# Altium footprint library Altium_Lib.PcbLib: 334 footprints (part 21 of 21)
Each footprint in its own frame and in the unit in brackets; x right, y up, seen from the top. Pads: shape width x height; smd on the part's side, far side on the other; paste and mask are expansions set on the pad; w line width, h text height; cw(c..) or ccw(c..) is an arc to the next point about the centre after c.
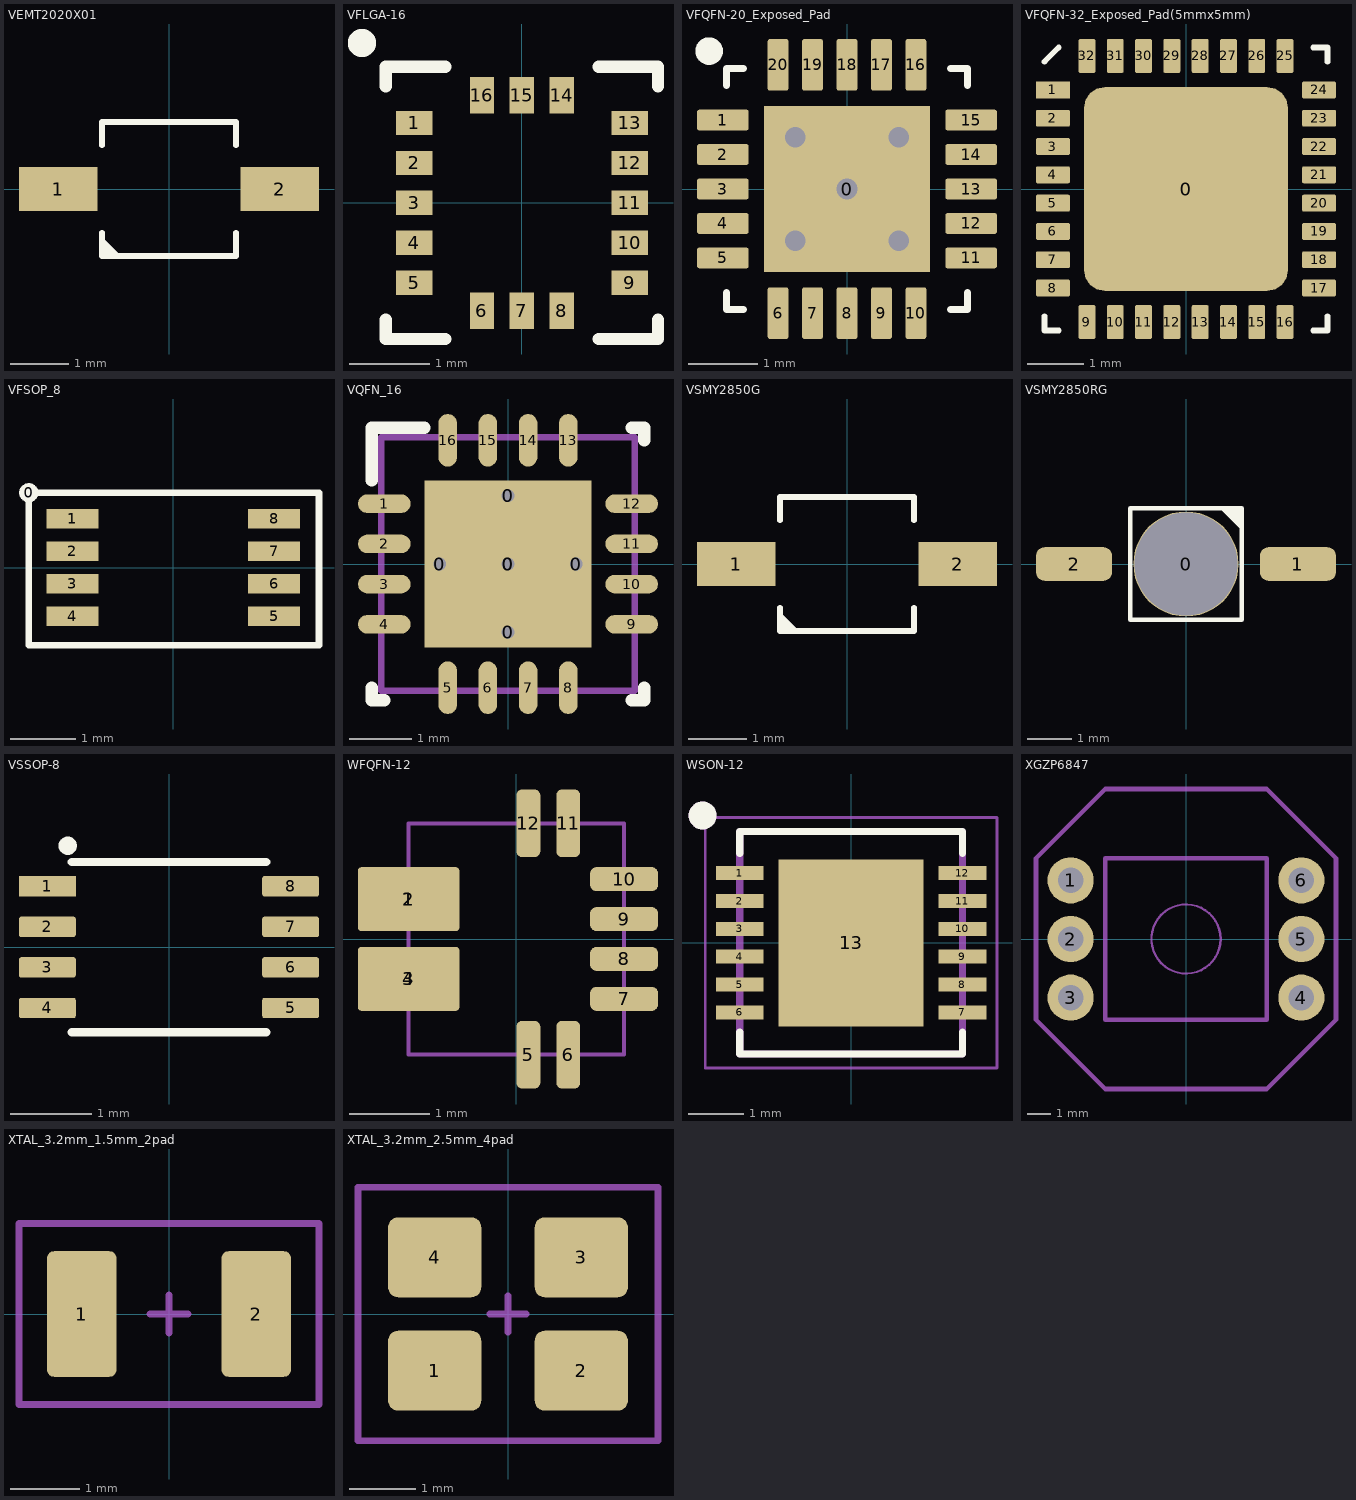
[diagram p20: the footprints below, top view; thin cyan lines are the x and y axes]

## VEMT2020X01 [mm]
pads (2):
  rect 1.35x0.75 smd: 1(-1.9,0) 2(1.9,0)
Top Overlay:
  region: -1.15,-0.825 -0.825,-1.15 -1.15,-1.15
  lines w0.1: -1.15,-0.75 -1.15,-1.15 0.85,-1.15 1.15,-1.15 1.15,-0.75 ; -1.15,0.75 -1.15,1.15 1.15,1.15 1.15,0.75
3D body "User Library-VEMT2020X01.STEP": height 2.77, standoff 0.05, extent -2.1,-1.15 2.1,1.15

## VFLGA-16 [mil]
height 39.37
pads (16):
  rect 18x12 smd: 1(-53,39.37) 2(-53,19.68) 3(-53,0) 4(-53,-19.68) 5(-53,-39.37) 9(53,-39.37) 10(53,-19.68) 11(53,0) 12(53,19.68) 13(53,39.37)
  rect 12x18 smd: 6(-19.68,-53) 7(0,-53) 8(19.68,-53) 14(19.68,53) 15(0,53) 16(-19.68,53)
Top Overlay:
  circle w10: c-78.74,78.74 r1.97
  lines w6: -67,-57.48 -67,-67 -37.79,-67 ; -67,57.48 -67,67 -37.79,67 ; 37.79,-67 67,-67 67,-57.48 ; 37.79,67 67,67 67,57.48
3D body "LGA-16_3x3x1mm_STM.step": height 39.09, standoff 0, extent -62,-62.01 62.01,62.01

## VFQFN-20_Exposed_Pad [mm]
pads (21):
  rect 2.4x2.4 smd mask-2.8: 0(0,0)
  rrect20% 0.75x0.3 smd mask+0.05: 1(-1.8,1) 2(-1.8,0.5) 3(-1.8,0) 4(-1.8,-0.5) 5(-1.8,-1) 11(1.8,-1) 12(1.8,-0.5) 13(1.8,0) 14(1.8,0.5) 15(1.8,1)
  rrect20% 0.3x0.75 smd mask+0.05: 6(-1,-1.8) 7(-0.5,-1.8) 8(0,-1.8) 9(0.5,-1.8) 10(1,-1.8) 16(1,1.8) 17(0.5,1.8) 18(0,1.8) 19(-0.5,1.8) 20(-1,1.8)
via 0,0 diameter 0.5 hole 0.3
via -0.75,-0.75 diameter 0.5 hole 0.3
via -0.75,0.75 diameter 0.5 hole 0.3
via 0.75,0.75 diameter 0.5 hole 0.3
via 0.75,-0.75 diameter 0.5 hole 0.3
Top Overlay:
  circle w0.2: c-2,2 r0.1
  lines w0.1: -1.75,-1.5 -1.75,-1.75 -1.5,-1.75 ; -1.75,1.5 -1.75,1.75 -1.5,1.75 ; 1.5,-1.75 1.75,-1.75 1.75,-1.5 ; 1.5,1.75 1.75,1.75 1.75,1.5
Top Solder:
  rectangle: -1.15,-0.4 -0.35,0.4
  rectangle: 0.35,-0.4 1.15,0.4
  rectangle: -0.4,0.35 0.4,1.15
  rectangle: -0.4,-1.15 0.4,-0.35
3D body "User Library-PVQFN20-RGR.STEP": height 1, standoff 0, extent -1.751,-1.751 1.751,1.751

## VFQFN-32_Exposed_Pad(5mmx5mm) [mm]
pads (33):
  rrect20% 3.6x3.6 smd mask+0.05: 0(0,0)
  rect 0.6x0.3 smd mask+0.05: 1(-2.35,1.75)
  rrect20% 0.6x0.3 smd mask+0.05: 2(-2.35,1.25) 3(-2.35,0.75) 4(-2.35,0.25) 5(-2.35,-0.25) 6(-2.35,-0.75) 7(-2.35,-1.25) 8(-2.35,-1.75) 17(2.35,-1.75) 18(2.35,-1.25) 19(2.35,-0.75) 20(2.35,-0.25) 21(2.35,0.25) 22(2.35,0.75) 23(2.35,1.25) 24(2.35,1.75)
  rrect20% 0.3x0.6 smd mask+0.05: 9(-1.75,-2.35) 10(-1.25,-2.35) 11(-0.75,-2.35) 12(-0.25,-2.35) 13(0.25,-2.35) 14(0.75,-2.35) 15(1.25,-2.35) 16(1.75,-2.35) 25(1.75,2.35) 26(1.25,2.35) 27(0.75,2.35) 28(0.25,2.35) 29(-0.25,2.35) 30(-0.75,2.35) 31(-1.25,2.35) 32(-1.75,2.35)
Top Overlay:
  lines w0.1: -2.5,-2.25 -2.5,-2.5 -2.25,-2.5 ; -2.5,2.25 -2.25,2.5 ; 2.25,-2.5 2.5,-2.5 2.5,-2.25 ; 2.25,2.5 2.5,2.5 2.5,2.25
3D body "User Library-VQFN-32.STEP": height 1.01, standoff 0, extent -2.56,-2.56 2.56,2.56

## VFSOP_8 [mm]
pads (9):
  round 0.3 on Top Overlay: 0(-2.22,1.15)
  rect 0.8x0.3 smd: 1(-1.55,0.75) 2(-1.55,0.25) 3(-1.55,-0.25) 4(-1.55,-0.75) 5(1.55,-0.75) 6(1.55,-0.25) 7(1.55,0.25) 8(1.55,0.75)
Top Overlay:
  lines w0.1: -2.22,-1.19 -2.22,1.15 2.24,1.15 2.24,-1.19 -2.22,-1.19
3D body "User Library-TI_DCU.STEP": height 0.9, standoff 0, extent -1.587,-1.01 1.52,0.99

## VQFN_16 [mm]
pads (22):
  round 0.5 hole 0.203 mask-25.4: 0(-1.1,0) 0(0,-1.1) 0(0,0) 0(0,1.1) 0(1.1,0)
  rect 2.7x2.7 smd: 0(0,0)
  oval 0.85x0.3 smd: 1(-2,0.975) 2(-2,0.325) 3(-2,-0.325) 4(-2,-0.975) 9(2,-0.975) 10(2,-0.325) 11(2,0.325) 12(2,0.975)
  oval 0.3x0.85 smd: 5(-0.975,-2) 6(-0.325,-2) 7(0.325,-2) 8(0.975,-2) 13(0.975,2) 14(0.325,2) 15(-0.325,2) 16(-0.975,2)
Top Overlay:
  lines w0.2: -2.2,-2 -2.2,-2.2 -2,-2.2 ; -2.2,1.35 -2.2,2.2 -1.35,2.2 ; 2,-2.2 2.2,-2.2 2.2,-2 ; 2,2.2 2.2,2.2 2.2,2
Top Solder:
  region: 0,1.407 -0.117,1.383 -0.217,1.317 -0.283,1.217 -0.307,1.1 -0.283,0.983 -0.217,0.883 -0.117,0.817 0,0.793 0.117,0.817 0.217,0.883 0.283,0.983 0.307,1.1 0.283,1.217 0.217,1.317 0.117,1.383
  region: -1.1,0.307 -1.217,0.283 -1.317,0.217 -1.383,0.117 -1.407,0 -1.383,-0.117 -1.317,-0.217 -1.217,-0.283 -1.1,-0.307 -0.983,-0.283 -0.883,-0.217 -0.817,-0.117 -0.793,0 -0.817,0.117 -0.883,0.217 -0.983,0.283
  region: 0,0.307 -0.117,0.283 -0.217,0.217 -0.283,0.117 -0.307,0 -0.283,-0.117 -0.217,-0.217 -0.117,-0.283 0,-0.307 0.117,-0.283 0.217,-0.217 0.283,-0.117 0.307,0 0.283,0.117 0.217,0.217 0.117,0.283
  region: 1.1,0.307 0.983,0.283 0.883,0.217 0.817,0.117 0.793,0 0.817,-0.117 0.883,-0.217 0.983,-0.283 1.1,-0.307 1.217,-0.283 1.317,-0.217 1.383,-0.117 1.407,0 1.383,0.117 1.317,0.217 1.217,0.283
  region: 0,-0.793 -0.117,-0.817 -0.217,-0.883 -0.283,-0.983 -0.307,-1.1 -0.283,-1.217 -0.217,-1.317 -0.117,-1.383 0,-1.407 0.117,-1.383 0.217,-1.317 0.283,-1.217 0.307,-1.1 0.283,-0.983 0.217,-0.883 0.117,-0.817
Bottom Solder:
  region: 0,1.407 -0.117,1.383 -0.217,1.317 -0.283,1.217 -0.307,1.1 -0.283,0.983 -0.217,0.883 -0.117,0.817 0,0.793 0.117,0.817 0.217,0.883 0.283,0.983 0.307,1.1 0.283,1.217 0.217,1.317 0.117,1.383
  region: -1.1,0.307 -1.217,0.283 -1.317,0.217 -1.383,0.117 -1.407,0 -1.383,-0.117 -1.317,-0.217 -1.217,-0.283 -1.1,-0.307 -0.983,-0.283 -0.883,-0.217 -0.817,-0.117 -0.793,0 -0.817,0.117 -0.883,0.217 -0.983,0.283
  region: 0,0.307 -0.117,0.283 -0.217,0.217 -0.283,0.117 -0.307,0 -0.283,-0.117 -0.217,-0.217 -0.117,-0.283 0,-0.307 0.117,-0.283 0.217,-0.217 0.283,-0.117 0.307,0 0.283,0.117 0.217,0.217 0.117,0.283
  region: 1.1,0.307 0.983,0.283 0.883,0.217 0.817,0.117 0.793,0 0.817,-0.117 0.883,-0.217 0.983,-0.283 1.1,-0.307 1.217,-0.283 1.317,-0.217 1.383,-0.117 1.407,0 1.383,0.117 1.317,0.217 1.217,0.283
  region: 0,-0.793 -0.117,-0.817 -0.217,-0.883 -0.283,-0.983 -0.307,-1.1 -0.283,-1.217 -0.217,-1.317 -0.117,-1.383 0,-1.407 0.117,-1.383 0.217,-1.317 0.283,-1.217 0.307,-1.1 0.283,-0.983 0.217,-0.883 0.117,-0.817
Mechanical 1:
  lines w0.1: -2.05,-2.05 -2.05,2.05 2.05,2.05 2.05,-2.05 -2.05,-2.05
3D body "TPS61092RSAR.STEP": height 1, standoff 0, extent -2,-2 2,2

## VSMY2850G [mm]
pads (2):
  rect 1.35x0.75 smd: 1(-1.9,0) 2(1.9,0)
Top Overlay:
  region: -1.15,-0.825 -0.825,-1.15 -1.15,-1.15
  lines w0.1: -1.15,-0.75 -1.15,-1.15 0.85,-1.15 1.15,-1.15 1.15,-0.75 ; -1.15,0.75 -1.15,1.15 1.15,1.15 1.15,0.75
3D body "User Library-VSMB2020X01.STEP": height 2.77, standoff 0.05, extent -2.1,-1.15 2.1,1.15

## VSMY2850RG [mm]
pads (3):
  round 2.35 hole 2.3: 0(0,0)
  rrect50% 1.7x0.75 smd: 1(2.5,0) 2(-2.5,0)
Top Overlay:
  region: 0.75,1.25 1.25,0.75 1.25,1.25
  lines w0.1: -1.25,-1.25 1.25,-1.25 1.25,1.25 -1.25,1.25 -1.25,-1.25
3D body "User Library-VSMY2850RG.STEP": height 1.65, standoff -1.12, extent -2.907,-1.15 2.907,1.15

## VSSOP-8 [mm]
pads (8):
  rect 0.7x0.25 smd: 1(-1.5,0.75)
  rrect20% 0.7x0.25 smd: 2(-1.5,0.25) 3(-1.5,-0.25) 4(-1.5,-0.75) 5(1.5,-0.75) 6(1.5,-0.25) 7(1.5,0.25) 8(1.5,0.75)
Top Overlay:
  circle w0.125: c-1.25,1.25 r0.05
  lines w0.1: -1.2,-1.05 1.2,-1.05 ; -1.2,1.05 1.2,1.05
3D body "User Library-VSSOP8-1.STEP": height 0.9, standoff 0, extent -1.6,-1.05 1.6,1.05

## WFQFN-12 [mm]
pads (12):
  rrect10% 1.27x0.8 smd mask+0.05: 1(-1.35,0.5) 2(-1.35,0.5) 3(-1.35,-0.5) 4(-1.35,-0.5)
  rrect50% 0.3x0.85 smd mask+0.05: 5(0.15,-1.45) 6(0.65,-1.45) 11(0.65,1.45) 12(0.15,1.45)
  rrect50% 0.85x0.3 smd mask+0.05: 7(1.35,-0.75) 8(1.35,-0.25) 9(1.35,0.25) 10(1.35,0.75)
Mechanical 13:
  lines w0.05: -1.35,-1.45 -1.35,1.45 1.35,1.45 1.35,-1.45 -1.35,-1.45
3D body: height 0.75, standoff 0, extent -1.375,-1.475 1.375,1.475

## WSON-12 [mm]
height 2.03
pads (13):
  rect 0.86x0.25 smd: 1(-2,1.25) 2(-2,0.75) 3(-2,0.25) 4(-2,-0.25) 5(-2,-0.75) 6(-2,-1.25) 7(2,-1.25) 8(2,-0.75) 9(2,-0.25) 10(2,0.25) 11(2,0.75) 12(2,1.25)
  rect 2.6x3 smd paste-3: 13(0,0)
Top Overlay:
  circle w0.3: c-2.667,2.286 r0.1
  lines w0.127: -2,-1.6 -2,-2 2,-2 2,-1.6 ; -2,1.6 -2,2 2,2 2,1.6
Top Paste:
  region: 0.135,-0.135 1.025,-0.135 1.025,-1.227 0.135,-1.227
  region: -1.027,-0.135 -0.135,-0.135 -0.135,-1.227 -1.027,-1.227
  region: 0.135,1.225 1.025,1.225 1.025,0.135 0.135,0.135
  region: -1.027,1.225 -0.135,1.225 -0.135,0.135 -1.027,0.135
Mechanical 4:
  lines w0.05: -2.62,-2.25 -2.62,2.25 2.62,2.25 2.62,-2.25 -2.62,-2.25
Mechanical 13:
  circle w0.3: c-2.667,2.286 r0.1
  lines w0.127: -2,-2 -2,2 2,2 2,-2 -2,-2
3D body "ldc1612.stp": height 0.8, standoff 0, extent -2,-2 2,2

## XGZP6847 [mm]
pads (6):
  round 2 hole 1.1: 1(-5,2.54) 2(-5,0) 3(-5,-2.54) 4(5,-2.54) 5(5,0) 6(5,2.54)
Mechanical 10:
  circle w0.1: c0,0 r1.5
  circle w0.1: c-5,2.5 r0.4
  circle w0.1: c-5,0 r0.4
  circle w0.1: c-5,-2.5 r0.4
  circle w0.1: c5,-2.5 r0.4
  circle w0.1: c5,0 r0.4
  circle w0.1: c5,2.5 r0.4
  lines w0.2: -6.5,-3.5 -3.5,-6.5 ; -6.5,-3.5 -6.5,3.5 -3.5,6.5 3.5,6.5 6.5,3.5 6.5,-3.5 3.5,-6.5 -3.5,-6.5 ; -6.5,-3.5 -3.5,-6.5 ; -3.5,-3.5 3.5,-3.5 3.5,3.5 -3.5,3.5 -3.5,-3.5
3D body: height 12.6, standoff 6.6, extent -1.499,-1.499 1.499,1.499
3D body: height 6.6, standoff 3.6, extent -3.499,-3.499 3.499,3.499
3D body: height 2, standoff -6, extent -5.399,-2.899 -4.601,-2.101
3D body: height 2, standoff -6, extent -5.399,-0.399 -4.601,0.399
3D body: height 2, standoff -6, extent -5.399,2.101 -4.601,2.899
3D body: height 2, standoff -6, extent 4.601,-2.899 5.399,-2.101
3D body: height 2, standoff -6, extent 4.601,-0.399 5.399,0.399
3D body: height 2, standoff -6, extent 4.601,2.101 5.399,2.899
3D body: height 3.6, standoff 2, extent -6.6,-6.6 6.6,6.6

## XTAL_3.2mm_1.5mm_2pad [mm]
height 1.3
pads (2):
  rrect20% 1x1.8 smd mask+0.102: 1(-1.25,0) 2(1.25,0)
Mechanical 15:
  lines w0.1: -0.275,0 0.275,0 ; 0,-0.275 0,0.275 ; -2.15,-1.3 2.15,-1.3 2.15,1.3 -2.15,1.3 -2.15,-1.3
3D body "XTAL_SMD_32x15_A.STEP": height 0.91, standoff 0, extent -1.61,-0.76 1.61,0.76

## XTAL_3.2mm_2.5mm_4pad [mm]
height 1.3
pads (4):
  rrect25% 1.4x1.2 smd mask+0.102: 1(-1.1,-0.85) 2(1.1,-0.85) 3(1.1,0.85) 4(-1.1,0.85)
Mechanical 15:
  lines w0.1: -0.275,0 0.275,0 ; 0,-0.275 0,0.275 ; -2.25,-1.9 2.25,-1.9 2.25,1.9 -2.25,1.9 -2.25,-1.9
3D body: height 0.1, standoff 0, extent -1.55,-1.2 -0.6,-0.35
3D body: height 0.1, standoff 0, extent -1.55,0.35 -0.6,1.2
3D body: height 0.1, standoff 0, extent 0.6,0.35 1.55,1.2
3D body "XTAL_SMD_32x25_A.step": height 0.81, standoff 0.01, extent -1.65,-1.3 1.65,1.3
3D body: height 0.1, standoff 0, extent 0.6,-1.2 1.55,-0.35